# Altium footprint library 7-Connectors-10.PcbLib: 25 footprints (part 2 of 2)
Each footprint in its own frame and in the unit in brackets; x right, y up, seen from the top. Pads: shape width x height; smd on the part's side, far side on the other; paste and mask are expansions set on the pad; w line width, h text height; cw(c..) or ccw(c..) is an arc to the next point about the centre after c.
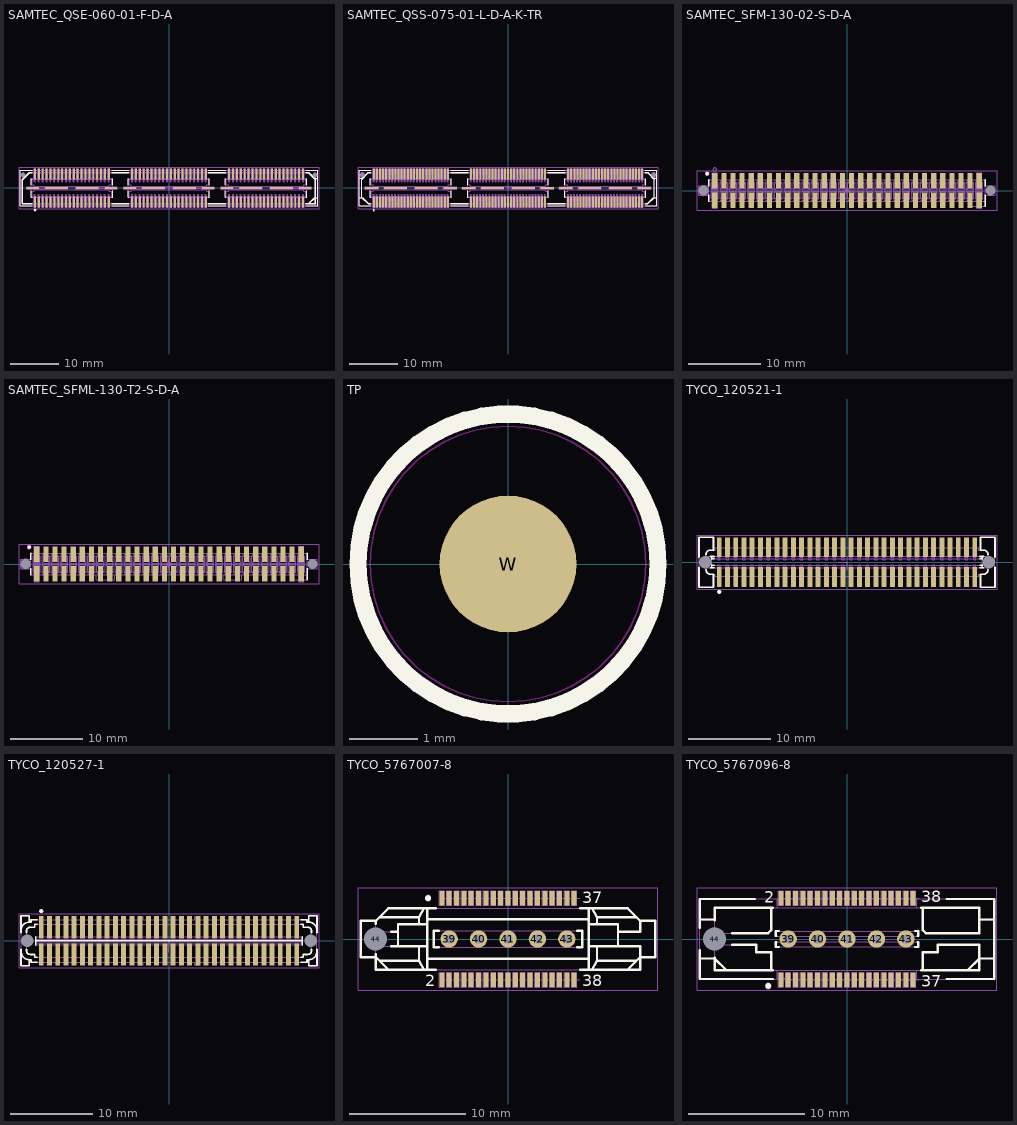
[diagram p1: the footprints below, top view; thin cyan lines are the x and y axes]

## SAMTEC_QSE-060-01-F-D-A [mm] "120 Contacts Female, Pitch 0.8mm, Straight Double Row High Speed Ground Plane Socket"
height 3.25
pads (134):
  rect 0.406x2.273 smd mask+0: 1(-27.6,-2.865) 2(-27.6,2.865) 3(-26.8,-2.865) 4(-26.8,2.865) 5(-26,-2.865) 6(-26,2.865) 7(-25.2,-2.865) 8(-25.2,2.865) 9(-24.4,-2.865) 10(-24.4,2.865) 11(-23.6,-2.865) 12(-23.6,2.865) 13(-22.8,-2.865) 14(-22.8,2.865) 15(-22,-2.865) 16(-22,2.865) 17(-21.2,-2.865) 18(-21.2,2.865) 19(-20.4,-2.865) 20(-20.4,2.865) 21(-19.6,-2.865) 22(-19.6,2.865) 23(-18.8,-2.865) 24(-18.8,2.865) 25(-18,-2.865) 26(-18,2.865) 27(-17.2,-2.865) 28(-17.2,2.865) 29(-16.4,-2.865) 30(-16.4,2.865) 31(-15.6,-2.865) 32(-15.6,2.865) 33(-14.8,-2.865) 34(-14.8,2.865) 35(-14,-2.865) 36(-14,2.865) 37(-13.2,-2.865) 38(-13.2,2.865) 39(-12.4,-2.865) 40(-12.4,2.865) 41(-7.6,-2.865) 42(-7.6,2.865) 43(-6.8,-2.865) 44(-6.8,2.865) 45(-6,-2.865) 46(-6,2.865) 47(-5.2,-2.865) 48(-5.2,2.865) 49(-4.4,-2.865) 50(-4.4,2.865) 51(-3.6,-2.865) 52(-3.6,2.865) 53(-2.8,-2.865) 54(-2.8,2.865) 55(-2,-2.865) 56(-2,2.865) 57(-1.2,-2.865) 58(-1.2,2.865) 59(-0.4,-2.865) 60(-0.4,2.865) 61(0.4,-2.865) 62(0.4,2.865) 63(1.2,-2.865) 64(1.2,2.865) 65(2,-2.865) 66(2,2.865) 67(2.8,-2.865) 68(2.8,2.865) 69(3.6,-2.865) 70(3.6,2.865) 71(4.4,-2.865) 72(4.4,2.865) 73(5.2,-2.865) 74(5.2,2.865) 75(6,-2.865) 76(6,2.865) 77(6.8,-2.865) 78(6.8,2.865) 79(7.6,-2.865) 80(7.6,2.865) 81(12.4,-2.865) 82(12.4,2.865) 83(13.2,-2.865) 84(13.2,2.865) 85(14,-2.865) 86(14,2.865) 87(14.8,-2.865) 88(14.8,2.865) 89(15.6,-2.865) 90(15.6,2.865) 91(16.4,-2.865) 92(16.4,2.865) 93(17.2,-2.865) 94(17.2,2.865) 95(18,-2.865) 96(18,2.865) 97(18.8,-2.865) 98(18.8,2.865) 99(19.6,-2.865) 100(19.6,2.865) 101(20.4,-2.865) 102(20.4,2.865) 103(21.2,-2.865) 104(21.2,2.865) 105(22,-2.865) 106(22,2.865) 107(22.8,-2.865) 108(22.8,2.865) 109(23.6,-2.865) 110(23.6,2.865) 111(24.4,-2.865) 112(24.4,2.865) 113(25.2,-2.865) 114(25.2,2.865) 115(26,-2.865) 116(26,2.865) 117(26.8,-2.865) 118(26.8,2.865) 119(27.6,-2.865) 120(27.6,2.865)
  rect 2.54x0.43 smd mask+0: 121(-28.065,0) 124(-11.935,0) 125(-8.065,0) 128(8.065,0) 129(11.935,0) 132(28.065,0)
  rect 4.699x0.432 smd mask+0: 122(-23.175,0) 123(-16.825,0) 126(-3.175,0) 127(3.175,0) 130(16.825,0) 131(23.175,0)
  round 0.5 hole 1 unplated mask+0.25: 133(-30.065,2.665) 134(30.065,2.665)
Top Overlay:
  circle w0.3: c-27.602,-4.55 r0.125
  lines w0.2: -28.321,-0.615 -28.321,-1.905 -28.205,-1.905 ; -28.321,0.615 -28.321,1.905 -28.205,1.905 ; -28.205,-3.62 -30.639,-3.62 -30.639,3.62 -28.205,3.62 ; -28.205,-3.258 -30.227,-3.258 ; -28.205,-3.112 -30.08,-3.112 ; -28.205,3.112 -28.683,3.112 ; -28.205,3.258 -28.744,3.258 ; -11.795,-3.62 -8.28,-3.62 ; -11.795,-3.258 -8.28,-3.258 ; -11.795,-3.112 -8.28,-3.112 ; -11.795,-1.905 -11.607,-1.905 -11.607,-0.615 ; -11.795,1.905 -11.607,1.905 -11.607,0.615 ; -11.795,3.112 -8.28,3.112 ; -11.795,3.258 -8.28,3.258 ; -11.795,3.62 -8.28,3.62 ; -8.396,-0.615 -8.396,-1.905 -8.28,-1.905 ; -8.396,0.615 -8.396,1.905 -8.28,1.905 ; 8.13,-3.62 11.723,-3.62 ; 8.13,-3.258 11.723,-3.258 ; 8.13,-3.112 11.723,-3.112 ; 8.13,-1.905 8.319,-1.905 8.319,-0.615 ; 8.13,1.905 8.319,1.905 8.319,0.615 ; 8.13,3.112 11.723,3.112 ; 8.13,3.258 11.723,3.258 ; 8.13,3.62 11.723,3.62 ; 11.607,-0.615 11.607,-1.905 11.723,-1.905 ; 11.607,0.615 11.607,1.905 11.723,1.905 ; 28.133,-3.62 30.639,-3.62 ; 28.133,-3.258 30.227,-3.258 ; 28.133,-3.112 30.08,-3.112 ; 28.133,-1.905 28.321,-1.905 ; 28.133,1.905 28.321,1.905 ; 28.133,3.112 28.683,3.112 ; 28.133,3.258 28.744,3.258 ; 28.133,3.62 30.639,3.62 ; 28.22,-3.62 30.639,-3.62 ; 28.22,-3.258 28.794,-3.258 ; 28.22,-3.112 28.734,-3.112 ; 28.22,-1.905 28.321,-1.905 ; 28.22,1.905 28.321,1.905 ; 28.22,3.112 28.734,3.112 ; 28.22,3.258 28.794,3.258 ; 28.22,3.62 30.639,3.62 ; 28.321,0.615 28.321,1.905 ; 28.321,0.617 28.321,1.905 ; 29.877,1.968 30.639,1.968 ; 30.084,-1.968 28.794,-3.258 ; 30.084,1.968 28.794,3.258 ; 30.131,-1.968 30.131,1.714 28.734,3.112 ; 30.639,-1.968 29.877,-1.968 28.734,-3.112 ; -30.227,-3.258 -30.227,1.775 ; -30.227,-3.258 -30.08,-3.112 ; -30.227,1.775 -30.08,1.714 ; -30.227,1.775 -28.744,3.258 ; -30.08,-3.112 -30.08,1.714 ; -30.08,1.714 -28.683,3.112 ; -28.744,3.258 -28.683,3.112 ; 28.321,-1.905 28.321,-0.614 28.321,-1.905 ; 28.683,3.112 30.08,1.714 ; 28.683,3.112 28.744,3.258 ; 28.734,-3.112 28.794,-3.258 ; 28.734,3.112 28.794,3.258 ; 28.744,3.258 30.227,1.775 ; 30.08,-3.112 30.08,1.714 ; 30.08,-3.112 30.227,-3.258 ; 30.08,1.714 30.227,1.775 ; 30.227,-3.258 30.227,1.775 ; 30.639,-3.62 30.639,3.62 ; 30.639,-3.62 30.639,3.62
Mechanical 8:
  drawing of 805 lines, arcs and shapes, not listed
Mechanical 14:
  drawing of 869 lines, arcs and shapes, not listed
Mechanical 15:
  lines w0.05: -30.889,-4.25 -30.889,4.25 30.889,4.25 30.889,-4.25 -30.889,-4.25
3D body "SAMTEC_QSE-060-01-F-D-A.stp": height 3.25, standoff -0.75, extent -30.639,-3.746 30.639,3.747

## SAMTEC_QSS-075-01-L-D-A-K-TR [mm] "150 Contacts Female, Pitch 0.635mm, Straight Double Row High Speed Socket"
height 3.63
pads (164):
  rect 0.406x2.273 smd mask+0: 1(-27.623,-2.865) 2(-27.623,2.865) 3(-26.988,-2.865) 4(-26.988,2.865) 5(-26.353,-2.865) 6(-26.353,2.865) 7(-25.718,-2.865) 8(-25.718,2.865) 9(-25.083,-2.865) 10(-25.083,2.865) 11(-24.448,-2.865) 12(-24.448,2.865) 13(-23.813,-2.865) 14(-23.813,2.865) 15(-23.178,-2.865) 16(-23.178,2.865) 17(-22.543,-2.865) 18(-22.543,2.865) 19(-21.908,-2.865) 20(-21.908,2.865) 21(-21.273,-2.865) 22(-21.273,2.865) 23(-20.638,-2.865) 24(-20.638,2.865) 25(-20.003,-2.865) 26(-20.003,2.865) 27(-19.368,-2.865) 28(-19.368,2.865) 29(-18.733,-2.865) 30(-18.733,2.865) 31(-18.098,-2.865) 32(-18.098,2.865) 33(-17.463,-2.865) 34(-17.463,2.865) 35(-16.828,-2.865) 36(-16.828,2.865) 37(-16.193,-2.865) 38(-16.193,2.865) 39(-15.558,-2.865) 40(-15.558,2.865) 41(-14.923,-2.865) 42(-14.923,2.865) 43(-14.288,-2.865) 44(-14.288,2.865) 45(-13.653,-2.865) 46(-13.653,2.865) 47(-13.018,-2.865) 48(-13.018,2.865) 49(-12.383,-2.865) 50(-12.383,2.865) 51(-7.62,-2.865) 52(-7.62,2.865) 53(-6.985,-2.865) 54(-6.985,2.865) 55(-6.35,-2.865) 56(-6.35,2.865) 57(-5.715,-2.865) 58(-5.715,2.865) 59(-5.08,-2.865) 60(-5.08,2.865) 61(-4.445,-2.865) 62(-4.445,2.865) 63(-3.81,-2.865) 64(-3.81,2.865) 65(-3.175,-2.865) 66(-3.175,2.865) 67(-2.54,-2.865) 68(-2.54,2.865) 69(-1.905,-2.865) 70(-1.905,2.865) 71(-1.27,-2.865) 72(-1.27,2.865) 73(-0.635,-2.865) 74(-0.635,2.865) 75(0,-2.865) 76(0,2.865) 77(0.635,-2.865) 78(0.635,2.865) 79(1.27,-2.865) 80(1.27,2.865) 81(1.905,-2.865) 82(1.905,2.865) 83(2.54,-2.865) 84(2.54,2.865) 85(3.175,-2.865) 86(3.175,2.865) 87(3.81,-2.865) 88(3.81,2.865) 89(4.445,-2.865) 90(4.445,2.865) 91(5.08,-2.865) 92(5.08,2.865) 93(5.715,-2.865) 94(5.715,2.865) 95(6.35,-2.865) 96(6.35,2.865) 97(6.985,-2.865) 98(6.985,2.865) 99(7.62,-2.865) 100(7.62,2.865) 101(12.383,-2.865) 102(12.383,2.865) 103(13.018,-2.865) 104(13.018,2.865) 105(13.653,-2.865) 106(13.653,2.865) 107(14.288,-2.865) 108(14.288,2.865) 109(14.923,-2.865) 110(14.923,2.865) 111(15.558,-2.865) 112(15.558,2.865) 113(16.193,-2.865) 114(16.193,2.865) 115(16.828,-2.865) 116(16.828,2.865) 117(17.463,-2.865) 118(17.463,2.865) 119(18.098,-2.865) 120(18.098,2.865) 121(18.733,-2.865) 122(18.733,2.865) 123(19.368,-2.865) 124(19.368,2.865) 125(20.003,-2.865) 126(20.003,2.865) 127(20.638,-2.865) 128(20.638,2.865) 129(21.273,-2.865) 130(21.273,2.865) 131(21.908,-2.865) 132(21.908,2.865) 133(22.543,-2.865) 134(22.543,2.865) 135(23.178,-2.865) 136(23.178,2.865) 137(23.813,-2.865) 138(23.813,2.865) 139(24.448,-2.865) 140(24.448,2.865) 141(25.083,-2.865) 142(25.083,2.865) 143(25.718,-2.865) 144(25.718,2.865) 145(26.353,-2.865) 146(26.353,2.865) 147(26.988,-2.865) 148(26.988,2.865) 149(27.623,-2.865) 150(27.623,2.865)
  rect 2.794x0.432 smd mask+0: 151(-28.065,-0.002) 154(-11.935,-0.002) 155(-8.068,-0.017) 158(8.062,-0.017) 159(11.935,0.002) 162(28.065,0.002)
  rect 4.699x0.432 smd mask+0: 152(-23.175,-0.002) 153(-16.825,-0.002) 156(-3.178,-0.017) 157(3.172,-0.017) 160(16.825,0.002) 161(23.175,0.002)
  round 0.5 hole 1 unplated mask+0.25: 163(-30,2.657) 164(30,2.657)
Top Overlay:
  circle w0.25: c-27.625,-4.55 r0.125
  lines w0.2: -30.639,-1.968 -29.877,-1.968 -28.734,-3.112 ; -30.639,1.968 -29.877,1.968 ; -30.131,-1.968 -30.131,1.714 -28.734,3.112 ; -30.084,-1.968 -28.794,-3.258 ; -30.084,1.968 -28.794,3.258 ; -28.321,-0.614 -28.321,-1.905 -28.225,-1.905 ; -28.321,0.617 -28.321,1.905 -28.225,1.905 ; -28.225,-3.62 -30.639,-3.62 -30.639,3.62 -28.225,3.62 ; -28.225,-3.258 -28.794,-3.258 ; -28.225,-3.112 -28.734,-3.112 ; -28.225,3.112 -28.734,3.112 ; -28.225,3.258 -28.794,3.258 ; -11.785,-3.62 -8.222,-3.62 ; -11.785,-3.258 -8.222,-3.258 ; -11.785,-3.112 -8.222,-3.112 ; -11.785,-1.905 -11.684,-1.905 -11.684,-0.614 ; -11.785,1.905 -11.684,1.905 -11.684,0.617 ; -11.785,3.112 -8.222,3.112 ; -11.785,3.258 -8.222,3.258 ; -11.785,3.62 -8.222,3.62 ; -8.319,-0.614 -8.319,-1.905 -8.222,-1.905 ; -8.319,0.617 -8.319,1.905 -8.222,1.905 ; 8.218,-3.62 11.78,-3.62 ; 8.218,-3.258 11.78,-3.258 ; 8.218,-3.112 11.78,-3.112 ; 8.218,-1.905 8.319,-1.905 8.319,-0.614 ; 8.218,1.905 8.319,1.905 8.319,0.617 ; 8.218,3.112 11.78,3.112 ; 8.218,3.258 11.78,3.258 ; 8.218,3.62 11.78,3.62 ; 11.684,-0.614 11.684,-1.905 11.78,-1.905 ; 11.684,0.617 11.684,1.905 11.78,1.905 ; 28.22,-3.62 30.639,-3.62 30.639,3.62 28.22,3.62 ; 28.22,-3.258 28.794,-3.258 ; 28.22,-3.112 28.734,-3.112 ; 28.22,-1.905 28.321,-1.905 28.321,-0.614 ; 28.22,1.905 28.321,1.905 28.321,0.617 ; 28.22,3.112 28.734,3.112 ; 28.22,3.258 28.794,3.258 ; 29.877,1.968 30.639,1.968 ; 30.084,-1.968 28.794,-3.258 ; 30.084,1.968 28.794,3.258 ; 30.131,-1.968 30.131,1.714 28.734,3.112 ; 30.639,-1.968 29.877,-1.968 28.734,-3.112 ; -28.794,-3.258 -28.734,-3.112 ; -28.794,3.258 -28.734,3.112 ; 28.734,-3.112 28.794,-3.258 ; 28.734,3.112 28.794,3.258
Mechanical 8:
  drawing of 986 lines, arcs and shapes, not listed
Mechanical 14:
  drawing of 842 lines, arcs and shapes, not listed
Mechanical 15:
  lines w0.05: -30.889,-4.249 30.889,-4.249 30.889,4.252 -30.889,4.252 -30.889,-4.249
3D body "SAMTEC_QSS-075-01-L-D-A-K-TR.stp": height 3.63, standoff -0.75, extent -30.639,-3.746 30.639,3.747

## SAMTEC_SFM-130-02-S-D-A [mm] "60 Contacts - Pitch 1.27mm - Top Entry, Dual Row Surface Mount Receptacle With Alignment Pin"
height 4.75
pads (62):
  rect 0.73x2.2 smd: 1(-18.415,1.365) 2(-18.415,-1.365) 3(-17.145,1.365) 4(-17.145,-1.365) 5(-15.875,1.365) 6(-15.875,-1.365) 7(-14.605,1.365) 8(-14.605,-1.365) 9(-13.335,1.365) 10(-13.335,-1.365) 11(-12.065,1.365) 12(-12.065,-1.365) 13(-10.795,1.365) 14(-10.795,-1.365) 15(-9.525,1.365) 16(-9.525,-1.365) 17(-8.255,1.365) 18(-8.255,-1.365) 19(-6.985,1.365) 20(-6.985,-1.365) 21(-5.715,1.365) 22(-5.715,-1.365) 23(-4.445,1.365) 24(-4.445,-1.365) 25(-3.175,1.365) 26(-3.175,-1.365) 27(-1.905,1.365) 28(-1.905,-1.365) 29(-0.635,1.365) 30(-0.635,-1.365) 31(0.635,1.365) 32(0.635,-1.365) 33(1.905,1.365) 34(1.905,-1.365) 35(3.175,1.365) 36(3.175,-1.365) 37(4.445,1.365) 38(4.445,-1.365) 39(5.715,1.365) 40(5.715,-1.365) 41(6.985,1.365) 42(6.985,-1.365) 43(8.255,1.365) 44(8.255,-1.365) 45(9.525,1.365) 46(9.525,-1.365) 47(10.795,1.365) 48(10.795,-1.365) 49(12.065,1.365) 50(12.065,-1.365) 51(13.335,1.365) 52(13.335,-1.365) 53(14.605,1.365) 54(14.605,-1.365) 55(15.875,1.365) 56(15.875,-1.365) 57(17.145,1.365) 58(17.145,-1.365) 59(18.415,1.365) 60(18.415,-1.365)
  round 1 hole 1.4 unplated mask+0.2: MEC1(-20,0) MEC2(20,0)
Top Overlay:
  circle w0.25: c-19.467,2.35 r0.125
  circle w0.25: c-19.467,2.35 r0.125
  lines w0.2: -19.236,-0.564 -19.236,-1.524 -19.18,-1.524 ; -19.236,0.564 -19.236,1.524 -19.18,1.524 ; 19.18,-2.159 19.236,-2.159 19.236,-1.524 ; 19.18,-1.524 19.236,-1.524 ; 19.18,1.524 19.236,1.524 19.236,0.564 ; 19.236,-0.564 19.236,-1.524
Mechanical 8:
  drawing of 209 lines, arcs and shapes, not listed
Mechanical 14:
  drawing of 741 lines, arcs and shapes, not listed
Mechanical 15:
  lines w0.1: -20.888,-2.725 20.888,-2.725 20.888,2.725 -20.888,2.725 -20.888,-2.725
3D body "SAMTEC_SFM-130-02-S-D-A.stp": height 4.7, standoff -1.14, extent -20.637,-2.159 20.638,2.096

## SAMTEC_SFML-130-T2-S-D-A [mm] "60 Contacts - Pitch 1.27mm - Top Entry, Dual Row Surface Mount Receptacle With Alignment Pin And Locking Tab"
height 4.57
pads (62):
  rect 0.73x2.2 smd: 1(-18.415,1.365) 2(-18.415,-1.365) 3(-17.145,1.365) 4(-17.145,-1.365) 5(-15.875,1.365) 6(-15.875,-1.365) 7(-14.605,1.365) 8(-14.605,-1.365) 9(-13.335,1.365) 10(-13.335,-1.365) 11(-12.065,1.365) 12(-12.065,-1.365) 13(-10.795,1.365) 14(-10.795,-1.365) 15(-9.525,1.365) 16(-9.525,-1.365) 17(-8.255,1.365) 18(-8.255,-1.365) 19(-6.985,1.365) 20(-6.985,-1.365) 21(-5.715,1.365) 22(-5.715,-1.365) 23(-4.445,1.365) 24(-4.445,-1.365) 25(-3.175,1.365) 26(-3.175,-1.365) 27(-1.905,1.365) 28(-1.905,-1.365) 29(-0.635,1.365) 30(-0.635,-1.365) 31(0.635,1.365) 32(0.635,-1.365) 33(1.905,1.365) 34(1.905,-1.365) 35(3.175,1.365) 36(3.175,-1.365) 37(4.445,1.365) 38(4.445,-1.365) 39(5.715,1.365) 40(5.715,-1.365) 41(6.985,1.365) 42(6.985,-1.365) 43(8.255,1.365) 44(8.255,-1.365) 45(9.525,1.365) 46(9.525,-1.365) 47(10.795,1.365) 48(10.795,-1.365) 49(12.065,1.365) 50(12.065,-1.365) 51(13.335,1.365) 52(13.335,-1.365) 53(14.605,1.365) 54(14.605,-1.365) 55(15.875,1.365) 56(15.875,-1.365) 57(17.145,1.365) 58(17.145,-1.365) 59(18.415,1.365) 60(18.415,-1.365)
  round 1 hole 1.4 unplated mask+0.2: MEC1(-20,0) MEC2(20,0)
Top Overlay:
  circle w0.25: c-19.467,2.35 r0.125
  circle w0.25: c-19.467,2.35 r0.125
  lines w0.2: -19.236,-0.564 -19.236,-1.524 -19.18,-1.524 ; -19.236,0.564 -19.236,1.524 -19.18,1.524 ; 19.18,-2.159 19.236,-2.159 19.236,-1.524 ; 19.18,-1.524 19.236,-1.524 ; 19.18,1.524 19.236,1.524 19.236,0.564 ; 19.236,-0.564 19.236,-1.524
Mechanical 8:
  drawing of 209 lines, arcs and shapes, not listed
Mechanical 14:
  drawing of 746 lines, arcs and shapes, not listed
Mechanical 15:
  lines w0.1: -20.888,-2.725 20.888,-2.725 20.888,2.725 -20.888,2.725 -20.888,-2.725
3D body "SAMTEC_SFML-130-T2-S-D-A.stp": height 4.7, standoff -1.14, extent -20.637,-2.21 20.638,2.096

## TP [mm]
height 11.7
pads (1):
  round 2 smd mask+1: W(0,0)
Top Overlay:
  circle w0.254: c0,0 r2.195
Keep-Out Layer:
  circle w0.025: c0,0 r2.017
3D body "1_016-1_016-3_tp.stp": height 0.02, standoff 0, extent -1.5,-1.5 1.5,1.5

## TYCO_120521-1 [mm] "2x32 Position, 1mm Centerline, Surface Mount, Stacking Board-to-Board Female Connector (IEEE 1386 Mezzanine Connector)"
height 5.4
pads (66):
  rect 0.6x2.4 smd: 1(-15.5,-1.8) 2(-15.5,1.8) 3(-14.5,-1.8) 4(-14.5,1.8) 5(-13.5,-1.8) 6(-13.5,1.8) 7(-12.5,-1.8) 8(-12.5,1.8) 9(-11.5,-1.8) 10(-11.5,1.8) 11(-10.5,-1.8) 12(-10.5,1.8) 13(-9.5,-1.8) 14(-9.5,1.8) 15(-8.5,-1.8) 16(-8.5,1.8) 17(-7.5,-1.8) 18(-7.5,1.8) 19(-6.5,-1.8) 20(-6.5,1.8) 21(-5.5,-1.8) 22(-5.5,1.8) 23(-4.5,-1.8) 24(-4.5,1.8) 25(-3.5,-1.8) 26(-3.5,1.8) 27(-2.5,-1.8) 28(-2.5,1.8) 29(-1.5,-1.8) 30(-1.5,1.8) 31(-0.5,-1.8) 32(-0.5,1.8) 33(0.5,-1.8) 34(0.5,1.8) 35(1.5,-1.8) 36(1.5,1.8) 37(2.5,-1.8) 38(2.5,1.8) 39(3.5,-1.8) 40(3.5,1.8) 41(4.5,-1.8) 42(4.5,1.8) 43(5.5,-1.8) 44(5.5,1.8) 45(6.5,-1.8) 46(6.5,1.8) 47(7.5,-1.8) 48(7.5,1.8) 49(8.5,-1.8) 50(8.5,1.8) 51(9.5,-1.8) 52(9.5,1.8) 53(10.5,-1.8) 54(10.5,1.8) 55(11.5,-1.8) 56(11.5,1.8) 57(12.5,-1.8) 58(12.5,1.8) 59(13.5,-1.8) 60(13.5,1.8) 61(14.5,-1.8) 62(14.5,1.8) 63(15.5,-1.8) 64(15.5,1.8)
  round 1 hole 1.5 unplated: 65(-17.2,0) 66(17.2,0)
Top Overlay:
  circle w0.25: c-15.5,-3.6 r0.125
  lines w0.2: -17.95,-0.6 -17.95,-3.025 -16.2,-3.025 -16.2,-1.46 -16.56,-1.46 cw(c-16.56,-0.91) -17.11,-0.91 ; -17.95,0.6 -17.95,3.025 -16.2,3.025 -16.2,1.46 -16.56,1.46 ccw(c-16.56,0.91) -17.11,0.91 ; -16.6,-0.69 -16.1,-0.69 ; -16.6,0.69 -16.1,0.69 ; -16.4,-0.69 -16.4,-0.345 ; -16.4,-0.396 -16.1,-0.396 ; -16.4,0.345 -16.4,0.69 ; -16.4,0.396 -16.1,0.396 ; 16.1,-0.69 16.6,-0.69 ; 16.1,-0.396 16.4,-0.396 ; 16.1,0.396 16.4,0.396 ; 16.1,0.69 16.6,0.69 ; 16.4,-0.69 16.4,-0.345 ; 16.4,0.345 16.4,0.69 ; 17.11,-0.91 cw(c16.56,-0.91) 16.56,-1.46 16.2,-1.46 16.2,-3.025 17.95,-3.025 17.95,-0.6 ; 17.11,0.91 ccw(c16.56,0.91) 16.56,1.46 16.2,1.46 16.2,3.025 17.95,3.025 17.95,0.6
Mechanical 8:
  lines w0.1: -1,0 0,0 0,-1
Mechanical 14:
  drawing of 608 lines, arcs and shapes, not listed
Mechanical 15:
  lines w0.05: -18.2,-3.275 18.2,-3.275 18.2,3.275 -18.2,3.275 -18.2,-3.275
3D body "TYCO-AMP_120521-1.stp": height 5.4, standoff -0.73, extent -17.95,-3.025 17.95,3.025

## TYCO_120527-1 [mm] "1mm Centerline, FH (IEEE 1386) Surface Mount, Stacking Board-to-Board Male Connectors"
height 8.45
pads (66):
  rect 0.6x2.7 smd: 1(-15.5,1.65) 2(-15.5,-1.65) 3(-14.5,1.65) 4(-14.5,-1.65) 5(-13.5,1.65) 6(-13.5,-1.65) 7(-12.5,1.65) 8(-12.5,-1.65) 9(-11.5,1.65) 10(-11.5,-1.65) 11(-10.5,1.65) 12(-10.5,-1.65) 13(-9.5,1.65) 14(-9.5,-1.65) 15(-8.5,1.65) 16(-8.5,-1.65) 17(-7.5,1.65) 18(-7.5,-1.65) 19(-6.5,1.65) 20(-6.5,-1.65) 21(-5.5,1.65) 22(-5.5,-1.65) 23(-4.5,1.65) 24(-4.5,-1.65) 25(-3.5,1.65) 26(-3.5,-1.65) 27(-2.5,1.65) 28(-2.5,-1.65) 29(-1.5,1.65) 30(-1.5,-1.65) 31(-0.5,1.65) 32(-0.5,-1.65) 33(0.5,1.65) 34(0.5,-1.65) 35(1.5,1.65) 36(1.5,-1.65) 37(2.5,1.65) 38(2.5,-1.65) 39(3.5,1.65) 40(3.5,-1.65) 41(4.5,1.65) 42(4.5,-1.65) 43(5.5,1.65) 44(5.5,-1.65) 45(6.5,1.65) 46(6.5,-1.65) 47(7.5,1.65) 48(7.5,-1.65) 49(8.5,1.65) 50(8.5,-1.65) 51(9.5,1.65) 52(9.5,-1.65) 53(10.5,1.65) 54(10.5,-1.65) 55(11.5,1.65) 56(11.5,-1.65) 57(12.5,1.65) 58(12.5,-1.65) 59(13.5,1.65) 60(13.5,-1.65) 61(14.5,1.65) 62(14.5,-1.65) 63(15.5,1.65) 64(15.5,-1.65)
  round 1 hole 1.5 unplated: 65(-17.2,0) 66(17.2,0)
Top Overlay:
  circle w0.25: c-15.5,3.6 r0.125
  lines w0.2: -17.95,-1.275 ccw(c-16.95,-1.275) -16.95,-2.275 ; -17.95,-1 -17.95,-3.025 -16.95,-3.025 -16.95,-2.275 ; -17.95,1 -17.95,3.025 -16.95,3.025 -16.95,2.275 ; -17.95,1.275 cw(c-16.95,1.275) -16.95,2.275 ; -17.29,-1 -17.29,-1.2 ccw(c-16.84,-1.2) -16.84,-1.65 -16.3,-1.65 -16.3,-2 -16,-2 ; -17.29,1 -17.29,1.2 cw(c-16.84,1.2) -16.84,1.65 -16.3,1.65 -16.3,2 -16,2 ; -16.15,-0.5 -16.15,0.5 ; -16.15,0 16.15,0 ; -16,-2.575 -16.75,-2.575 -16.75,-2.275 -16.95,-2.275 ; -16,2.575 -16.75,2.575 -16.75,2.275 -16.95,2.275 ; 16,-2.575 16.75,-2.575 16.75,-2.275 16.95,-2.275 ; 16,-2 16.3,-2 16.3,-1.65 16.84,-1.65 ccw(c16.84,-1.2) 17.29,-1.2 17.29,-1 ; 16,2 16.3,2 16.3,1.65 16.84,1.65 cw(c16.84,1.2) 17.29,1.2 17.29,1 ; 16,2.575 16.75,2.575 16.75,2.275 16.95,2.275 ; 16.15,-0.5 16.15,0.5 ; 17.95,-1.275 cw(c16.95,-1.275) 16.95,-2.275 ; 17.95,-1 17.95,-3.025 16.95,-3.025 16.95,-2.275 ; 17.95,1 17.95,3.025 16.95,3.025 16.95,2.275 ; 17.95,1.275 ccw(c16.95,1.275) 16.95,2.275
Mechanical 14:
  drawing of 251 lines, arcs and shapes, not listed
Mechanical 15:
  lines w0.05: -18.2,-3.275 18.2,-3.275 18.2,3.275 -18.2,3.275 -18.2,-3.275
3D body "TYCO-AMP_120527-1.stp": height 8.38, standoff -0.73, extent -17.95,-3.025 17.95,3.025

## TYCO_5767007-8 [mm] "38 Positions, Pitch 25 [0.64], Centerline Matched Impedance Vertical Plug Connector (MICTOR)"
height 6.81
pads (44):
  rect 0.43x1.27 smd: 1(-5.715,3.53) 2(-5.715,-3.53) 3(-5.08,3.53) 4(-5.08,-3.53) 5(-4.445,3.53) 6(-4.445,-3.53) 7(-3.81,3.53) 8(-3.81,-3.53) 9(-3.175,3.53) 10(-3.175,-3.53) 11(-2.54,3.53) 12(-2.54,-3.53) 13(-1.905,3.53) 14(-1.905,-3.53) 15(-1.27,3.53) 16(-1.27,-3.53) 17(-0.635,3.53) 18(-0.635,-3.53) 19(0,3.53) 20(0,-3.53) 21(0.635,3.53) 22(0.635,-3.53) 23(1.27,3.53) 24(1.27,-3.53) 25(1.905,3.53) 26(1.905,-3.53) 27(2.54,3.53) 28(2.54,-3.53) 29(3.175,3.53) 30(3.175,-3.53) 31(3.81,3.53) 32(3.81,-3.53) 33(4.445,3.53) 34(4.445,-3.53) 35(5.08,3.53) 36(5.08,-3.53) 37(5.715,3.53) 38(5.715,-3.53)
  round 1.5 hole 0.8: 39(-5.08,0) 40(-2.54,0) 41(0,0) 42(2.54,0) 43(5.08,0)
  round 1 hole 2 unplated: 44(-11.43,0)
Top Overlay:
  circle w0.25: c-6.9,3.53 r0.125
  lines w0.2: -11.405,-1.325 -11.405,-1.575 ; -11.405,1.325 -11.405,1.575 ; -11.1,-1.88 -7.678,-1.88 ; -11.1,1.88 -7.678,1.88 ; -10.338,-2.642 -11.405,-1.575 ; -10.1,-0.635 -6.96,-0.635 ; -10.1,0.635 -9.5,0.635 ; -9.5,-0.635 -9.5,1.27 -6.96,1.27 ; -7.678,-0.635 -7.678,-1.88 ; -7.678,1.27 -7.678,1.88 ; -7.238,-2.642 -7.678,-1.88 ; -7.238,2.642 -7.678,1.88 ; -6.96,-2.642 -6.96,2.642 ; -6.96,-1.714 6.96,-1.714 ; -6.96,1.714 6.96,1.714 ; -6.239,-2.642 -11.405,-2.642 -11.405,-1.575 ; -6.239,2.642 -10.338,2.642 -11.405,1.575 ; -5.974,-0.724 -6.401,-0.724 -6.401,0.724 -5.974,0.724 ; 5.974,-0.724 6.401,-0.724 6.401,0.724 5.974,0.724 ; 6.239,-2.642 11.405,-2.642 11.405,-1.575 ; 6.239,2.642 10.338,2.642 11.405,1.575 ; 6.96,-2.642 6.96,2.642 ; 6.96,-0.635 11.405,-0.635 11.405,-1.575 ; 6.96,1.27 9.5,1.27 9.5,-0.635 ; 7.238,-2.642 7.678,-1.88 ; 7.238,2.642 7.678,1.88 ; 7.678,-0.635 7.678,-1.88 ; 7.678,1.27 7.678,1.88 ; 9.5,0.635 11.405,0.635 11.405,1.575 ; 10.338,-2.642 11.405,-1.575 ; 11.1,-1.88 7.678,-1.88 ; 11.1,1.88 7.678,1.88 ; -11.405,-1.575 -12.7,-1.575 -12.7,1.575 -11.405,1.575 ; 11.405,-1.575 12.7,-1.575 12.7,1.575 11.405,1.575
  text "37" at 6.425,3.086 h1
  text "38" at 6.4,-4.074 h1
  text "2" at -7.15,-4.086 h1
Mechanical 8:
  drawing of 290 lines, arcs and shapes, not listed
Mechanical 14:
  circle w0.1: c-6.9,3.53 r0.25
  lines w0.1: -11.1,-1.88 -7.678,-1.88 ; -11.1,1.88 -7.678,1.88 ; -10.338,-2.642 -11.405,-1.575 -12.7,-1.575 -12.7,1.575 -11.405,1.575 ; -9.5,-0.635 -9.5,1.27 -6.96,1.27 ; -9.5,0.635 -11.405,0.635 -11.405,1.575 ; -7.678,-0.635 -7.678,-1.88 ; -7.678,1.27 -7.678,1.88 ; -7.238,-2.642 -7.678,-1.88 ; -7.238,2.642 -7.678,1.88 ; -6.96,-2.642 -6.96,2.642 ; -6.96,-1.714 6.96,-1.714 ; -6.96,-0.635 -11.405,-0.635 -11.405,-2.642 11.405,-2.642 11.405,-0.635 6.96,-0.635 ; -6.96,1.714 6.96,1.714 ; -2.691,2.642 -2.691,2.667 -0.47,2.667 -0.47,2.642 ; -1.812,2.642 -1.812,2.667 ; -0.272,2.642 -0.272,2.667 2.576,2.667 2.576,2.642 ; 0.876,2.642 0.876,2.667 ; 1.152,2.642 1.152,2.667 ; 1.428,2.642 1.428,2.667 ; 2.618,2.642 2.618,2.667 5.08,2.667 5.08,2.642 ; 3.35,2.642 3.35,2.667 ; 4.348,2.642 4.348,2.667 ; 6.96,-2.642 6.96,2.642 ; 6.96,1.27 9.5,1.27 9.5,-0.635 ; 7.238,-2.642 7.678,-1.88 ; 7.238,2.642 7.678,1.88 ; 7.678,-0.635 7.678,-1.88 ; 7.678,1.27 7.678,1.88 ; 9.5,0.635 11.405,0.635 11.405,1.575 ; 10.338,-2.642 11.405,-1.575 12.7,-1.575 12.7,1.575 11.405,1.575 ; 11.1,-1.88 7.678,-1.88 ; 11.1,1.88 7.678,1.88 ; -11.405,1.575 -10.338,2.642 10.338,2.642 11.405,1.575 ; -6.401,-0.724 6.401,-0.724 6.401,0.724 -6.401,0.724 -6.401,-0.724
  text "37" at 6.425,3.086 h1
  text "38" at 6.4,-4.074 h1
  text "2" at -7.15,-4.086 h1
Mechanical 15:
  lines w0.1: -12.95,-4.415 -12.95,4.415 12.95,4.415 12.95,-4.415 -12.95,-4.415
3D body "TYCO_5767007-8.stp": height 6.53, standoff -1.37, extent -12.7,-4.356 12.7,4.356

## TYCO_5767096-8 [mm] "38 Positions, Pitch 25 [0.64], Centerline Matched Impedance Vertical Receptacle (MICTOR)"
height 6.14
pads (44):
  rect 0.43x1.27 smd: 1(-5.715,-3.53) 2(-5.715,3.53) 3(-5.08,-3.53) 4(-5.08,3.53) 5(-4.445,-3.53) 6(-4.445,3.53) 7(-3.81,-3.53) 8(-3.81,3.53) 9(-3.175,-3.53) 10(-3.175,3.53) 11(-2.54,-3.53) 12(-2.54,3.53) 13(-1.905,-3.53) 14(-1.905,3.53) 15(-1.27,-3.53) 16(-1.27,3.53) 17(-0.635,-3.53) 18(-0.635,3.53) 19(0,-3.53) 20(0,3.53) 21(0.635,-3.53) 22(0.635,3.53) 23(1.27,-3.53) 24(1.27,3.53) 25(1.905,-3.53) 26(1.905,3.53) 27(2.54,-3.53) 28(2.54,3.53) 29(3.175,-3.53) 30(3.175,3.53) 31(3.81,-3.53) 32(3.81,3.53) 33(4.445,-3.53) 34(4.445,3.53) 35(5.08,-3.53) 36(5.08,3.53) 37(5.715,-3.53) 38(5.715,3.53)
  round 1.5 hole 0.8: 39(-5.08,0) 40(-2.54,0) 41(0,0) 42(2.54,0) 43(5.08,0)
  round 1 hole 2 unplated: 44(-11.43,0)
Top Overlay:
  circle w0.25: c-6.8,-4.055 r0.125
  lines w0.2: -12.7,-1.676 -11.43,-1.676 ; -12.7,-0.973 -12.7,-3.454 -6.42,-3.454 ; -12.7,0.973 -12.7,3.454 -7.946,3.454 ; -12.7,1.676 -11.43,1.676 ; -11.43,-1.6 -11.43,-1.676 ; -11.43,1.6 -11.43,2.692 -6.553,2.692 ; -9.913,-0.508 -7.823,-0.508 -7.823,-1.143 -6.553,-1.143 -6.553,-2.692 ; -9.913,0.508 -6.807,0.508 -6.553,0.762 -6.553,2.692 ; -6.42,-2.692 -6.553,-2.692 ; -6.42,2.692 -6.553,2.692 ; -6.099,-0.254 -6.147,-0.254 -6.147,-0.686 -5.875,-0.686 ; -6.099,0.254 -6.147,0.254 -6.147,0.686 -5.875,0.686 ; 5.875,-0.686 6.147,-0.686 6.147,-0.254 6.099,-0.254 ; 5.875,0.686 6.147,0.686 6.147,0.254 6.099,0.254 ; 6.42,-2.692 6.553,-2.692 ; 6.42,2.692 6.553,2.692 ; 8.6,-3.454 12.7,-3.454 12.7,3.454 8.6,3.454 ; 11.43,1.676 12.7,1.676 ; 12.7,-1.676 11.43,-1.676 ; -11.43,-1.676 -11.43,-2.692 -10.414,-2.692 ; -11.43,-1.676 -10.414,-2.692 ; -10.414,-2.692 -6.553,-2.692 ; 6.553,-2.692 6.553,-1.143 7.823,-1.143 7.823,-0.508 11.43,-0.508 11.43,-1.676 ; 6.553,-2.692 10.414,-2.692 ; 6.553,2.692 11.43,2.692 11.43,0.508 6.807,0.508 6.553,0.762 6.553,2.692 ; 10.414,-2.692 11.43,-2.692 11.43,-1.676 ; 10.414,-2.692 11.43,-1.676
  text "2" at -7.125,3.149 h1
  text "37" at 6.4,-4.124 h1
  text "38" at 6.425,3.161 h1
Mechanical 8:
  drawing of 584 lines, arcs and shapes, not listed
Mechanical 14:
  circle w0.1: c-6.8,-4.055 r0.25
  lines w0.1: -12.7,-1.676 -11.43,-1.676 ; -12.7,1.676 -11.43,1.676 ; -6.02,-2.692 -6.02,-3.454 ; -6.02,2.692 -6.02,3.454 ; 6.02,-3.454 6.02,-2.692 ; 6.02,2.692 6.02,3.454 ; 11.43,1.676 12.7,1.676 ; 12.7,-1.676 11.43,-1.676 ; -11.43,-1.676 -11.43,-2.692 -10.414,-2.692 ; -11.43,-1.676 -10.414,-2.692 ; -11.43,-1.676 -11.43,-0.508 -7.823,-0.508 -7.823,-1.143 -6.553,-1.143 -6.553,-2.692 ; -10.414,-2.692 -6.553,-2.692 ; -6.553,-2.692 6.553,-2.692 ; -6.553,2.692 6.553,2.692 ; -6.553,2.692 -11.43,2.692 -11.43,0.508 -6.807,0.508 -6.553,0.762 -6.553,2.692 ; -6.02,-3.454 -6.02,-3.391 -5.004,-3.391 -5.004,-3.454 12.7,-3.454 12.7,3.454 -12.7,3.454 -12.7,-3.454 -6.02,-3.454 ; 6.553,-2.692 6.553,-1.143 7.823,-1.143 7.823,-0.508 11.43,-0.508 11.43,-1.676 ; 6.553,-2.692 10.414,-2.692 ; 6.553,2.692 11.43,2.692 11.43,0.508 6.807,0.508 6.553,0.762 6.553,2.692 ; 10.414,-2.692 11.43,-2.692 11.43,-1.676 ; 10.414,-2.692 11.43,-1.676 ; -6.147,-0.686 -6.147,-0.254 6.147,-0.254 6.147,-0.686 -6.147,-0.686 ; -6.147,0.254 -6.147,0.686 6.147,0.686 6.147,0.254 -6.147,0.254
  text "2" at -7.125,3.149 h1
  text "37" at 6.4,-4.124 h1
  text "38" at 6.425,3.161 h1
Mechanical 15:
  lines w0.1: -12.95,-4.415 -12.95,4.415 12.95,4.415 12.95,-4.415 -12.95,-4.415
3D body "TYCO_5767096-8.stp": height 6, standoff -1.39, extent -12.7,-4.356 12.7,4.356